# Altium footprint library qfuse_pcb_lib.PcbLib: 37 footprints (part 1 of 3)
Each footprint in its own frame and in the unit in brackets; x right, y up, seen from the top. Pads: shape width x height; smd on the part's side, far side on the other; paste and mask are expansions set on the pad; w line width, h text height; cw(c..) or ccw(c..) is an arc to the next point about the centre after c.
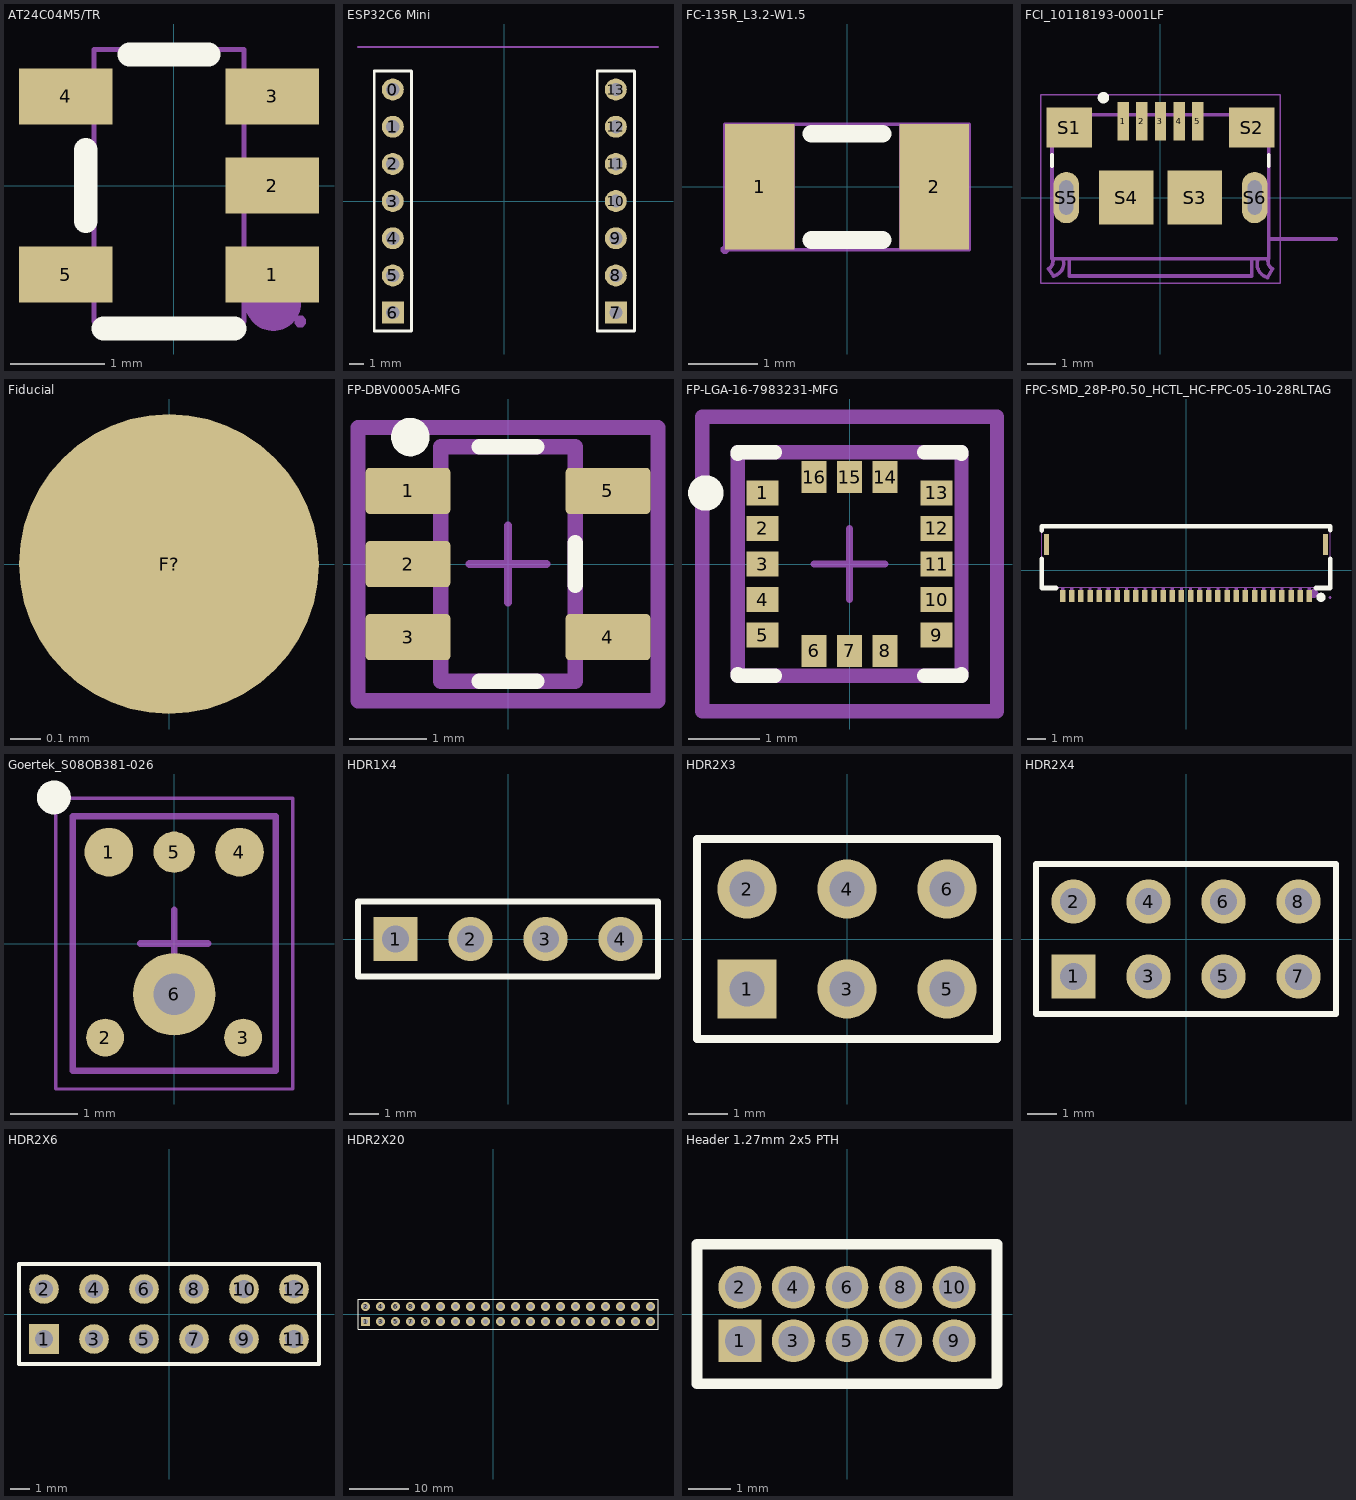
[diagram p0: the footprints below, top view; thin cyan lines are the x and y axes]

## 0603 Shunt Resistor [mm]

## AT24C04M5/TR [mm]
pads (5):
  rect 1x0.6 smd paste+0 mask+0.05: 1(1.049,-0.95) 2(1.049,0) 3(1.049,0.95) 4(-1.151,0.95) 5(-1.151,-0.95)
Top Overlay:
  lines w0.254: -0.94,-0.381 -0.94,0.381 ; -0.749,-1.524 0.648,-1.524 ; -0.473,1.397 0.371,1.397
Mechanical 6:
  circle w0.3: c1.059,-1.25 r0.15
Mechanical 15:
  region: 1.409,-1.45 1.409,-1.425 1.374,-1.39 1.324,-1.39 1.289,-1.425 1.289,-1.45 1.289,-1.475 1.324,-1.51 1.374,-1.51 1.409,-1.475
  region: -1.001,-1.15 -1.451,-1.15 -1.451,-0.75 -1.001,-0.75
  region: -0.841,-1.15 -1.011,-1.15 -1.011,-0.75 -0.841,-0.75
  region: -1.001,0.75 -1.451,0.75 -1.451,1.15 -1.001,1.15
  region: -0.841,0.75 -1.011,0.75 -1.011,1.15 -0.841,1.15
  region: 1.349,-1.15 0.899,-1.15 0.899,-0.75 1.349,-0.75
  region: 0.909,-1.15 0.739,-1.15 0.739,-0.75 0.909,-0.75
  region: 1.349,0.75 0.899,0.75 0.899,1.15 1.349,1.15
  region: 0.909,0.75 0.739,0.75 0.739,1.15 0.909,1.15
  region: 1.349,-0.2 0.899,-0.2 0.899,0.2 1.349,0.2
  region: 0.909,-0.2 0.739,-0.2 0.739,0.2 0.909,0.2
  lines w0.051: -0.851,-1.45 0.749,-1.45 0.749,1.45 -0.851,1.45 -0.851,-1.45
3D body "SOT23-5.step": height 1.1, standoff 0, extent -1.301,-1.5 1.199,1.5

## ESP32C6 Mini [mm]
pads (14):
  round 1.5 hole 0.9: 0(-7.62,7.62) 1(-7.62,5.08) 2(-7.62,2.54) 3(-7.62,0) 4(-7.62,-2.54) 5(-7.62,-5.08) 8(7.62,-5.08) 9(7.62,-2.54) 10(7.62,0) 11(7.62,2.54) 12(7.62,5.08) 13(7.62,7.62)
  rect 1.5x1.5 hole 0.9: 6(-7.62,-7.62) 7(7.62,-7.62)
Top Overlay:
  lines w0.2: -8.89,-8.89 -8.89,8.89 -6.35,8.89 -6.35,-8.89 -8.89,-8.89 ; 6.35,-8.89 6.35,8.89 8.89,8.89 8.89,-8.89 6.35,-8.89
Mechanical 1:
  lines w0.127: -10,10.541 10.5,10.541
  text "PCB EDGE" at 9.25,10.75 h0.41
3D body "ESP32C6 Assembly.STEP": height 12, standoff -3, extent -8.89,-10.413 8.89,12.069

## FC-135R_L3.2-W1.5 [mm]
pads (2):
  rect 1x1.8 smd paste+0 mask+0.051: 1(-1.25,0) 2(1.25,0)
Top Overlay:
  lines w0.254: -0.508,-0.762 0.508,-0.762 ; -0.508,0.762 0.508,0.762
Mechanical 15:
  region: -1.69,-0.9 -1.69,-0.875 -1.725,-0.84 -1.775,-0.84 -1.81,-0.875 -1.81,-0.9 -1.81,-0.925 -1.775,-0.96 -1.725,-0.96 -1.69,-0.925
  region: -1.75,-0.9 -1.75,0.9 -0.75,0.9 -0.75,-0.9
  region: 0.75,-0.9 0.75,0.9 1.75,0.9 1.75,-0.9
  lines w0.051: -1.75,-0.9 1.75,-0.9 1.75,0.9 -1.75,0.9 -1.75,-0.9
3D body "LGA14_2P5X3X0P91_TDK.step": height 0.97, standoff 0, extent -1.499,-1.245 1.499,1.245

## FCI_10118193-0001LF [mm]
pads (11):
  rect 0.4x1.35 smd: 1(-1.3,2.675) 2(-0.65,2.675) 3(0,2.675) 4(0.65,2.675) 5(1.3,2.675)
  rect 1.6x1.4 smd: S1(-3.2,2.45) S2(3.2,2.45)
  rect 1.9x1.9 smd: S3(1.2,0) S4(-1.2,0)
  oval 0.9x1.8 hole 0.5 slot 1.2 at 90 deg: S5(-3.3,0) S6(3.3,0)
Top Overlay:
  circle w0.2: c-2,3.5 r0.1
  lines w0.127: -3.8,1.1 -3.8,1.5 ; 3.8,1.1 3.8,1.5
Top Solder:
  rectangle: -1.602,1.897 1.602,3.453
Mechanical 13:
  lines w0.127: -3.93,-2.5 -3.75,-2.75 ; -3.93,-2.5 ccw(c-4.065,-2.235) -3.8,-2.1 ; -3.746,-2.749 ccw(c-3.85,-2.3) -3.401,-2.196 ; -3.2,-2.2 -3.2,-2.75 3.2,-2.75 3.2,-2.2 ; 3.401,-2.198 ccw(c3.875,-2.325) 3.748,-2.799 ; 3.75,-2.8 3.93,-2.5 ; 3.8,-2.1 ccw(c4.065,-2.235) 3.93,-2.5 ; 6.15,-1.45 3.8,-1.45 ; -3.8,-2.1 -3.8,-2.15 3.8,-2.15 3.8,-1.45 ; -3.8,-2.1 -3.8,2.9 3.8,2.9 3.8,-1.45
  text "PCB EDGE" at 4.5,-1.25 h0.41
Mechanical 15:
  lines w0.05: -4.2,-3 -4.2,3.6 4.2,3.6 4.2,-3 -4.2,-3
3D body "User Library-10118193.step": height 3.18, standoff -0.43, extent -3.928,-2.74 3.928,2.921

## Fiducial [mm]
pads (1):
  round 1 smd paste-2539.97 mask-2539.97: F?(0,0)
Top Solder:
  circle w1: c0,0 r0.5

## FP-DBV0005A-MFG [mm]
pads (5):
  rrect17% 1.1x0.6 smd paste+0: 1(-1.3,0.95) 2(-1.3,0) 3(-1.3,-0.95) 4(1.3,-0.95) 5(1.3,0.95)
Top Overlay:
  circle w0.25: c-1.27,1.651 r0.125
  lines w0.2: -0.375,-1.525 0.375,-1.525 ; -0.375,1.525 0.375,1.525 ; 0.875,-0.275 0.875,0.275
Top 3D Body:
  lines w0.2: -0.875,-1.525 -0.875,1.525 0.875,1.525 0.875,-1.525 -0.875,-1.525
Top Courtyard:
  lines w0.2: -1.95,-1.775 -1.95,1.775 1.95,1.775 1.95,-1.775 -1.95,-1.775
Top Assembly:
  lines w0.2: -1.95,-1.775 -1.95,1.775 1.95,1.775 1.95,-1.775 -1.95,-1.775
  text ".Designator" at 0,0 h1
Top Component Center:
  lines w0.1: -0.5,0 0.5,0 ; 0,-0.5 0,0.5
3D body "IC_Texas_Instruments_SN65LVDT2DBVT_eec.STEP": height 0.25, standoff 0, extent -1.95,-1.775 1.95,1.775

## FP-LGA-16-7983231-MFG [mm]
pads (16):
  rect 0.45x0.35 smd paste-1000 mask+0: 1(-1.225,1) 2(-1.225,0.5) 3(-1.225,0) 4(-1.225,-0.5) 5(-1.225,-1) 9(1.225,-1) 10(1.225,-0.5) 11(1.225,0) 12(1.225,0.5) 13(1.225,1)
  rect 0.35x0.45 smd paste-1000 mask+0: 6(-0.5,-1.225) 7(0,-1.225) 8(0.5,-1.225) 14(0.5,1.225) 15(0,1.225) 16(-0.5,1.225)
Top Overlay:
  circle w0.25: c-2.025,1 r0.125
  lines w0.2: -1.575,-1.55 -1.575,-1.575 -1.05,-1.575 ; -1.575,1.55 -1.575,1.575 -1.05,1.575 ; 1.05,-1.575 1.575,-1.575 1.575,-1.55 ; 1.05,1.575 1.575,1.575 1.575,1.55
Top Paste:
  rectangle: 0.343,1.024 0.657,1.426
  rectangle: -0.157,1.024 0.157,1.426
  rectangle: -0.657,1.024 -0.343,1.426
  rectangle: -1.426,0.843 -1.024,1.157
  rectangle: -1.426,0.343 -1.024,0.657
  rectangle: -1.426,-0.157 -1.024,0.157
  rectangle: -1.426,-0.657 -1.024,-0.343
  rectangle: -1.426,-1.157 -1.024,-0.843
  rectangle: -0.657,-1.426 -0.343,-1.024
  rectangle: -0.157,-1.426 0.157,-1.024
  rectangle: 0.343,-1.426 0.657,-1.024
  rectangle: 1.024,-1.157 1.426,-0.843
  rectangle: 1.024,-0.657 1.426,-0.343
  rectangle: 1.024,-0.157 1.426,0.157
  rectangle: 1.024,0.343 1.426,0.657
  rectangle: 1.024,0.843 1.426,1.157
Top 3D Body:
  lines w0.2: -1.575,-1.575 1.575,-1.575 1.575,1.575 -1.575,1.575 -1.575,-1.575
Top Courtyard:
  lines w0.2: -2.075,-2.075 2.075,-2.075 2.075,2.075 -2.075,2.075 -2.075,-2.075
Top Assembly:
  lines w0.2: -2.075,-2.075 2.075,-2.075 2.075,2.075 -2.075,2.075 -2.075,-2.075
  text ".Designator" at 0,0.188 h1
Top Component Center:
  lines w0.1: -0.5,0 0.5,0 ; 0,-0.5 0,0.5
3D body "IC_STMicroelectronics_LIS3DHTR_eec.STEP": height 0.25, standoff 0, extent -2.075,-2.075 2.075,2.075

## FPC-SMD_28P-P0.50_HCTL_HC-FPC-05-10-28RLTAG [mm]
pads (30):
  rect 0.3x0.65 smd paste+0 mask+0.03: 1(6.75,-1.405) 2(6.25,-1.405) 3(5.75,-1.405) 4(5.25,-1.405) 5(4.75,-1.405) 6(4.25,-1.405) 7(3.75,-1.405) 8(3.25,-1.405) 9(2.75,-1.405) 10(2.25,-1.405) 11(1.75,-1.405) 12(1.25,-1.405) 13(0.75,-1.405) 14(0.25,-1.405) 15(-0.25,-1.405) 16(-0.75,-1.405) 17(-1.25,-1.405) 18(-1.75,-1.405) 19(-2.25,-1.405) 20(-2.75,-1.405) 21(-3.25,-1.405) 22(-3.75,-1.405) 23(-4.25,-1.405) 24(-4.75,-1.405) 25(-5.25,-1.405) 26(-5.75,-1.405) 27(-6.25,-1.405) 28(-6.75,-1.405)
  rect 0.3x1.15 smd paste+0 mask+0.05: 29(-7.635,1.405) 30(7.635,1.405)
Top Overlay:
  circle w0.254: c7.385,-1.478 r0.127
  lines w0.254: -7.904,0.632 -7.904,-0.97 -7.103,-0.97 ; -7.904,2.178 -7.904,2.421 ; -7.885,2.421 7.885,2.421 ; 7.103,-0.97 7.893,-0.97 7.893,0.626 ; 7.893,2.184 7.893,2.421
Mechanical 6:
  circle w0.254: c6.985,-1.27 r0.127
Mechanical 15:
  drawing of 63 lines, arcs and shapes, not listed

## Goertek_S08OB381-026 [mm] "Goertek S08OB381-026 SMD package"
height 3.5
pads (6):
  round 0.72 smd: 1(-0.965,1.35) 4(0.965,1.35)
  round 0.56 smd: 2(-1.02,-1.39) 3(1.02,-1.39)
  round 0.61 smd: 5(0,1.35)
  round 1.22 hole 0.61: 6(0,-0.75)
Top Overlay:
  circle w0.25: c-1.778,2.159 r0.125
Top Solder:
  rectangle: -1.22,1.095 1.22,1.605
Mechanical 13:
  lines w0.1: -1.5,-1.88 1.5,-1.88 1.5,1.88 -1.5,1.88 -1.5,-1.88
Mechanical 15:
  lines w0.05: -1.75,-2.15 1.75,-2.15 1.75,2.15 -1.75,2.15 -1.75,-2.15
  lines w0.1: -0.5,0 0.5,0 ; 0,-0.5 0,0.5
3D body: height 1.1, standoff 0.3, extent -1.5,-1.88 1.5,1.88

## HDR1X4 [mm] "Connector; Header; 4 Position"
pads (4):
  rect 1.5x1.5 hole 0.9: 1(-3.81,0)
  round 1.5 hole 0.9: 2(-1.27,0) 3(1.27,0) 4(3.81,0)
Top Overlay:
  lines w0.2: -5.08,-1.27 5.08,-1.27 5.08,1.27 -5.08,1.27 -5.08,-1.27
3D body "4-Pin Header - Female - 2.54mm.step": height 5, standoff -3, extent -5.33,-1.25 5.33,1.25

## HDR2X3 [mm] "Connector; Header; 3x2 Position"
pads (6):
  rect 1.5x1.5 hole 0.9: 1(-2.54,-1.27)
  round 1.5 hole 0.9: 2(-2.54,1.27) 3(0,-1.27) 4(0,1.27) 5(2.54,-1.27) 6(2.54,1.27)
Top Overlay:
  lines w0.2: -1.058,-2.54 3.81,-2.54 ; 3.81,-2.54 3.81,2.54 -3.81,2.54 -3.81,-2.54 3.81,-2.54
3D body "6-Pin Header - Female - Double - 2.54mm.step": height 8.5, standoff -3, extent -4.06,-2.48 4.06,2.52

## HDR2X4 [mm] "Connector; Header; 4x2 Position"
pads (8):
  rect 1.5x1.5 hole 0.9: 1(-3.81,-1.27)
  round 1.5 hole 0.9: 2(-3.81,1.27) 3(-1.27,-1.27) 4(-1.27,1.27) 5(1.27,-1.27) 6(1.27,1.27) 7(3.81,-1.27) 8(3.81,1.27)
Top Overlay:
  lines w0.2: -5.08,-2.54 5.08,-2.54 5.08,2.54 -5.08,2.54 -5.08,-2.54
3D body "8-Pin Header - Female - Double - 2.54mm.step": height 8.5, standoff -3, extent -5.33,-2.48 5.33,2.52

## HDR2X6 [mm] "Connector; Header; 6x2 Position"
pads (12):
  rect 1.5x1.5 hole 0.9: 1(-6.35,-1.27)
  round 1.5 hole 0.9: 2(-6.35,1.27) 3(-3.81,-1.27) 4(-3.81,1.27) 5(-1.27,-1.27) 6(-1.27,1.27) 7(1.27,-1.27) 8(1.27,1.27) 9(3.81,-1.27) 10(3.81,1.27) 11(6.35,-1.27) 12(6.35,1.27)
Top Overlay:
  lines w0.2: -7.62,-2.54 7.62,-2.54 7.62,2.54 -7.62,2.54 -7.62,-2.54
3D body "12-Pin Header - Female - Double - 2.54mm.step": height 8.5, standoff -3, extent -7.87,-2.48 7.87,2.52

## HDR2X20 [mm] "Connector; Header; 20x2 Position"
pads (40):
  rect 1.5x1.5 hole 0.9: 1(-21.59,-1.27)
  round 1.5 hole 0.9: 2(-21.59,1.27) 3(-19.05,-1.27) 4(-19.05,1.27) 5(-16.51,-1.27) 6(-16.51,1.27) 7(-13.97,-1.27) 8(-13.97,1.27) 9(-11.43,-1.27) 10(-11.43,1.27) 11(-8.89,-1.27) 12(-8.89,1.27) 13(-6.35,-1.27) 14(-6.35,1.27) 15(-3.81,-1.27) 16(-3.81,1.27) 17(-1.27,-1.27) 18(-1.27,1.27) 19(1.27,-1.27) 20(1.27,1.27) 21(3.81,-1.27) 22(3.81,1.27) 23(6.35,-1.27) 24(6.35,1.27) 25(8.89,-1.27) 26(8.89,1.27) 27(11.43,-1.27) 28(11.43,1.27) 29(13.97,-1.27) 30(13.97,1.27) 31(16.51,-1.27) 32(16.51,1.27) 33(19.05,-1.27) 34(19.05,1.27) 35(21.59,-1.27) 36(21.59,1.27) 37(24.13,-1.27) 38(24.13,1.27) 39(26.67,-1.27) 40(26.67,1.27)
Top Overlay:
  lines w0.2: -22.86,-2.54 -22.86,2.54 27.94,2.54 27.94,-2.54 -22.86,-2.54
3D body "40-Pin Header - Female - Double - 2.54mm.step": height 8.5, standoff -3, extent -23.11,-2.48 28.19,2.52

## Header 1.27mm 2x5 PTH [mil] "Header 1.27mm pitch, 2x5, PTH through hole"
pads (10):
  rect 40x40 hole 28 mask+1.97: 1(-100,-25)
  round 40 hole 28 mask+1.97: 2(-100,25) 3(-50,-25) 4(-50,25) 5(0,-25) 6(0,25) 7(50,-25) 8(50,25) 9(100,-25) 10(100,25)
Top Overlay:
  lines w10: -140,-65 -140,65 140,65 140,-65 -140,-65
3D body "10-Pin Header 2x5 - Male - 1.27mm.STEP": height 236.22, standoff -102.36, extent -125,-66.93 125,66.93